# Altium footprint library Passive THD.PCBLIB: 80 footprints (part 3 of 5)
Each footprint in its own frame and in the unit in brackets; x right, y up, seen from the top. Pads: shape width x height; smd on the part's side, far side on the other; paste and mask are expansions set on the pad; w line width, h text height; cw(c..) or ccw(c..) is an arc to the next point about the centre after c.
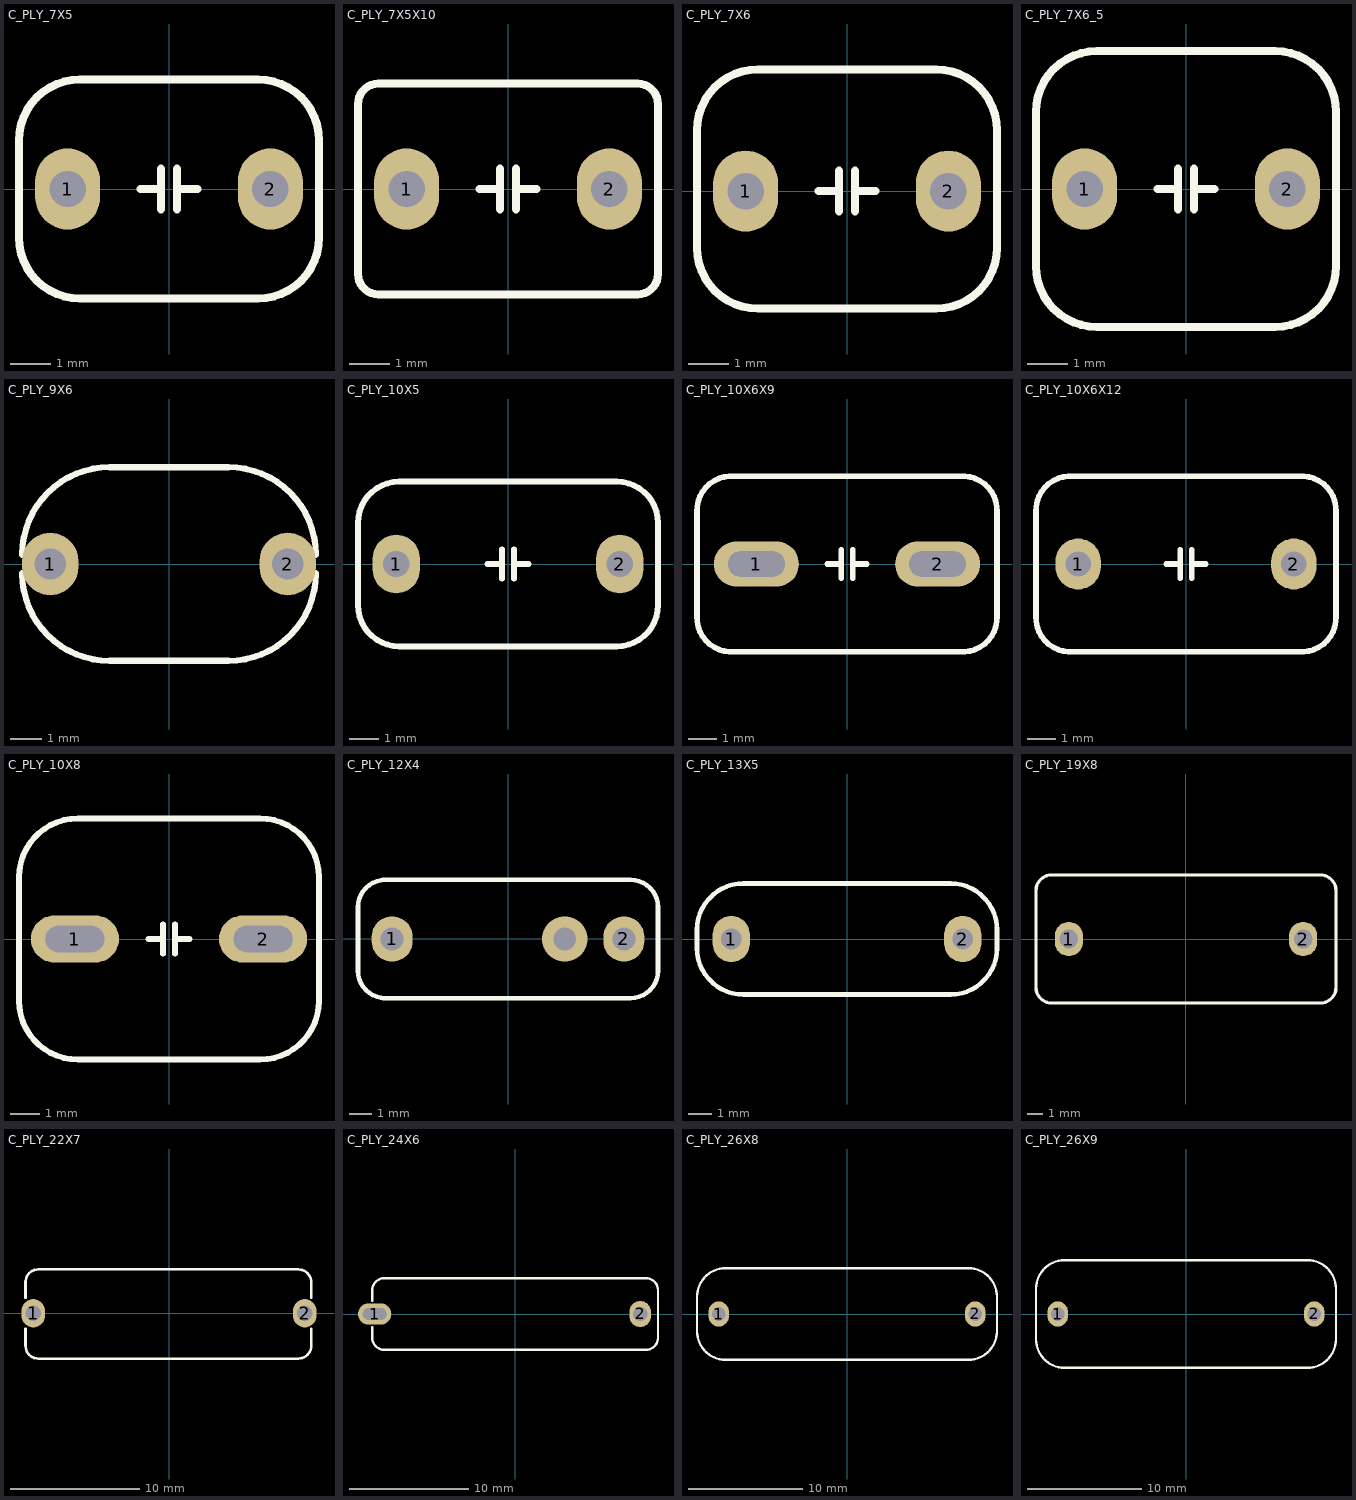
[diagram p2: the footprints below, top view; thin cyan lines are the x and y axes]

## C_PLY_7X5 [mm] "CAP, POLYESTER, 7.0X5.0mm pitch: 5.0mm"
height 7
pads (2):
  oval 1.6x2 hole 0.9: 1(-2.5,0) 2(2.5,0)
TopOverlay:
  lines w0.2: -0.7,0 -0.2,0 ; -0.2,-0.5 -0.2,0.5 ; 0.2,-0.5 0.2,0.5 ; 0.2,0 0.7,0 ; -3.7,-1.2 ccw(c-2.2,-1.2) -2.2,-2.7 2.2,-2.7 ccw(c2.2,-1.2) 3.7,-1.2 3.7,1.2 ccw(c2.2,1.2) 2.2,2.7 -2.2,2.7 ccw(c-2.2,1.2) -3.7,1.2 -3.7,-1.2
3D body "Cap, film, 7.3x5.2x7x5LS.STP": height 8, standoff -2, extent -3.65,-2.6 3.65,2.6

## C_PLY_7X5X10 [mm] "CAP, POLYESTER, 7.0X5.0x10mm pitch: 5.0mm"
height 7
pads (2):
  oval 1.6x2 hole 0.9: 1(-2.5,0) 2(2.5,0)
TopOverlay:
  lines w0.2: -0.7,0 -0.2,0 ; -0.2,-0.5 -0.2,0.5 ; 0.2,-0.5 0.2,0.5 ; 0.2,0 0.7,0 ; -3.7,-2.1 ccw(c-3.2,-2.1) -3.2,-2.6 3.2,-2.6 ccw(c3.2,-2.1) 3.7,-2.1 3.7,2.1 ccw(c3.2,2.1) 3.2,2.6 -3.2,2.6 ccw(c-3.2,2.1) -3.7,2.1 -3.7,-2.1
3D body "User Library-WIMA Capacitor_RM5-7.2X5X10.step": height 10, standoff -2.5, extent -3.6,-2.5 3.6,2.5

## C_PLY_7X6 [mm] "CAP, POLYESTER, 7.0X6.0mm pitch: 5.0mm"
height 7
pads (2):
  oval 1.6x2 hole 0.9: 1(-2.5,0) 2(2.5,0)
TopOverlay:
  lines w0.2: -0.7,0 -0.2,0 ; -0.2,-0.5 -0.2,0.5 ; 0.2,-0.5 0.2,0.5 ; 0.2,0 0.7,0 ; -3.7,-1.4 ccw(c-2.2,-1.4) -2.2,-2.9 2.2,-2.9 ccw(c2.2,-1.4) 3.7,-1.4 3.7,1.5 ccw(c2.2,1.5) 2.2,3 -2.2,3 ccw(c-2.2,1.5) -3.7,1.5 -3.7,-1.4
3D body "Cap, film, 7.3x5.7x7.3x5LS.STP": height 8.3, standoff -2, extent -3.65,-2.85 3.65,2.85

## C_PLY_7X6_5 [mm] "CAP, POLYESTER, 7.3X6.5mm pitch: 5.0mm"
height 10
pads (2):
  oval 1.6x2 hole 0.9: 1(-2.5,0) 2(2.5,0)
TopOverlay:
  lines w0.2: -0.7,0 -0.2,0 ; -0.2,-0.5 -0.2,0.5 ; 0.2,-0.5 0.2,0.5 ; 0.2,0 0.7,0 ; -3.7,-1.9 ccw(c-2.2,-1.9) -2.2,-3.4 2.2,-3.4 ccw(c2.2,-1.9) 3.7,-1.9 3.7,1.9 ccw(c2.2,1.9) 2.2,3.4 -2.2,3.4 ccw(c-2.2,1.9) -3.7,1.9 -3.7,-1.9
3D body "Cap, film, 7.3x6.5x10x5LS.STP": height 11, standoff -2, extent -3.65,-3.25 3.65,3.25

## C_PLY_9X6 [mm] "CAP, POLYESTER, 9.3X5.2mm pitch: 7.6mm"
pads (2):
  oval 1.8x2 hole 1: 1(-3.8,0) 2(3.8,0)
TopOverlay:
  lines w0.2: -4.7,-0.3 ccw(c-1.9,-0.3) -1.9,-3.1 1.9,-3.1 ccw(c1.9,-0.3) 4.7,-0.3 ; -4.7,0.3 cw(c-1.9,0.3) -1.9,3.1 1.9,3.1 cw(c1.9,0.3) 4.7,0.3
3D body "Cap 100n - 400V Poly.STEP": height 11.68, standoff -2.24, extent -4.585,-2.931 4.686,2.988

## C_PLY_10X5 [mm] "CAP, POLYESTER, 10X5.5mm pitch: 7.6mm"
height 9
pads (2):
  oval 1.6x2 hole 0.9 unplated mask+0.075: 1(-3.8,0) 2(3.8,0)
TopOverlay:
  lines w0.2: -0.7,0 -0.2,0 ; -0.2,-0.5 -0.2,0.5 ; 0.2,-0.5 0.2,0.5 ; 0.2,0 0.7,0 ; -5.1,-1.4 ccw(c-3.7,-1.4) -3.7,-2.8 3.7,-2.8 ccw(c3.7,-1.4) 5.1,-1.4 5.1,1.4 ccw(c3.7,1.4) 3.7,2.8 -3.7,2.8 ccw(c-3.7,1.4) -5.1,1.4 -5.1,-1.4
3D body "CAPF_5.5x9.0x10.0 TxHxW 7.5mmLS.STEP": height 9, standoff -2.54, extent -5,-2.75 5,2.75

## C_PLY_10X6X9 [mm] "CAP, POLYESTER, 10.5X6.0X9.0mm pitch: 7.6mm"
height 9
pads (2):
  oval 3x1.6 hole 0.9 slot 2 at 0 deg unplated mask+0.075: 1(-3.2,0) 2(3.2,0)
TopOverlay:
  lines w0.2: -0.7,0 -0.2,0 ; -0.2,-0.5 -0.2,0.5 ; 0.2,-0.5 0.2,0.5 ; 0.2,0 0.7,0 ; -5.299,-1.843 ccw(c-4.1,-1.9) -4.157,-3.099 4.157,-3.099 ccw(c4.1,-1.9) 5.299,-1.843 5.299,1.843 ccw(c4.1,1.9) 4.157,3.099 -4.157,3.099 ccw(c-4.1,1.9) -5.299,1.843 -5.299,-1.843
3D body "CAPF_6.0x9.0x10.5 TxHxW 7.5mmLS.STEP": height 9, standoff -2.54, extent -5.25,-3 5.25,3

## C_PLY_10X6X12 [mm] "CAP, POLYESTER, 10.3X6.0X12.0mm pitch: 7.6mm"
height 6
pads (2):
  oval 1.6x1.8 hole 0.9 unplated: 1(-3.81,0) 2(3.81,0)
TopOverlay:
  lines w0.2: -0.7,0 -0.2,0 ; -0.2,-0.5 -0.2,0.5 ; 0.2,-0.5 0.2,0.5 ; 0.2,0 0.7,0 ; -5.299,-1.843 ccw(c-4.1,-1.9) -4.157,-3.099 4.157,-3.099 ccw(c4.1,-1.9) 5.299,-1.843 5.299,1.843 ccw(c4.1,1.9) 4.157,3.099 -4.157,3.099 ccw(c-4.1,1.9) -5.299,1.843 -5.299,-1.843
3D body "CAPMF_10.3x6.0x13.0mm WxTxH 7.5mmLS.STEP": height 13, standoff -2.54, extent -5.15,-3 5.15,3

## C_PLY_10X8 [mm] "CAP, POLYESTER, 10.0X8.0 pitch: 7.6mm"
height 10
pads (2):
  oval 3x1.6 hole 0.9 slot 2 at 0 deg unplated mask+0.075: 1(-3.2,0) 2(3.2,0)
TopOverlay:
  lines w0.2: -0.7,0 -0.2,0 ; -0.2,-0.5 -0.2,0.5 ; 0.2,-0.5 0.2,0.5 ; 0.2,0 0.7,0 ; -5.1,-2.1 ccw(c-3.1,-2.1) -3.1,-4.1 3.1,-4.1 ccw(c3.1,-2.1) 5.1,-2.1 5.1,2.1 ccw(c3.1,2.1) 3.1,4.1 -3.1,4.1 ccw(c-3.1,2.1) -5.1,2.1 -5.1,-2.1
3D body "mfcap_7.5mm 10x8x11mm.stp": height 11, standoff -2.54, extent -5,-4 5,4

## C_PLY_12X4 [mm] "CAP, POLYESTER, 12.5X4.5X9.0 pitch: 10mm"
height 9
pads (2):
  oval 1.8x2 hole 1: 1(-5.1,0) 2(5.1,0)
via 2.5,0 diameter 2 hole 1
TopOverlay:
  lines w0.2: -5.5,-2.6 5.4,-2.6 ccw(c5.4,-1.4) 6.6,-1.4 6.6,1.4 ccw(c5.4,1.4) 5.4,2.6 -5.5,2.6 ; -5.4,-2.6 cw(c-5.4,-1.4) -6.6,-1.4 -6.6,1.4 cw(c-5.4,1.4) -5.4,2.6
3D body "User Library-Capacitor MKT_B32591C3104 (Pitch 10mm).step": height 12.5, standoff -6, extent -6.5,-2.5 6.5,2.5

## C_PLY_13X5 [mm] "CAP, POLYESTER, 12.8X4.8 pitch: 10mm"
pads (2):
  oval 1.6x2 hole 0.9: 1(-5,0) 2(5,0)
TopOverlay:
  lines w0.2: -6.48,-0.4 ccw(c-4.48,-0.4) -4.48,-2.4 4.48,-2.4 ccw(c4.48,-0.4) 6.48,-0.4 6.48,0.4 ccw(c4.48,0.4) 4.48,2.4 -4.48,2.4 ccw(c-4.48,0.4) -6.48,0.4 -6.48,-0.4
3D body "Cap 10n - 630V Poly_2009.STEP": height 12.19, standoff -1.73, extent -6.375,-2.401 6.375,2.35

## C_PLY_19X8 [mm] "CAP, POLYESTER, 19.0X8.0mm pitch: 15.0mm, 0.22uF 400V"
pads (2):
  oval 1.8x2.2 hole 1.2: 1(-7.5,0) 2(7.5,0)
TopOverlay:
  lines w0.2: -9.6,-3.1 ccw(c-8.6,-3.1) -8.6,-4.1 8.6,-4.1 ccw(c8.6,-3.1) 9.6,-3.1 9.6,3.1 ccw(c8.6,3.1) 8.6,4.1 -8.6,4.1 ccw(c-8.6,3.1) -9.6,3.1 -9.6,-3.1
3D body "User Library-CAP_POLY_15mm.step": height 16, standoff -4, extent -9.5,-4 9.5,4

## C_PLY_22X7 [mm] "CAP, POLYESTER, 33.0X7.0mm pitch: 20.0mm, 0.68uF 400V"
pads (2):
  oval 1.8x2.2 hole 1.2: 1(-10.5,0) 2(10.5,0)
TopOverlay:
  lines w0.2: -11.1,-1.2 -11.1,-2.5 ccw(c-10.1,-2.5) -10.1,-3.5 10,-3.5 ccw(c10,-2.5) 11,-2.5 11,-1.2 ; -11.1,1.2 -11.1,2.5 ; -11.1,2.4 cw(c-10.1,2.4) -10.1,3.4 10,3.4 cw(c10,2.4) 11,2.4 ; 11,1.2 11,2.5
3D body "User Library-ECQE(F) 0_33uf 630Vdc 250Vac.step": height 19, standoff -3, extent -13,-3.9 13,3.9

## C_PLY_24X6 [mm] "CAP, POLYESTER, 23.8X5.8mm pitch: 20.0mm, 0.33uF 400V"
pads (2):
  oval 2.8x1.8 hole 1 slot 2 at 0 deg: 1(-11.8,0)
  oval 1.8x2.2 hole 1.2: 2(10.5,0)
TopOverlay:
  lines w0.2: -12,-2.1 -12,-1.1 ; -12,-2 ccw(c-11,-2) -11,-3 11,-3 ccw(c11,-2) 12,-2 12,2.1 ; -12,1.1 -12,2.1 ; -12,2 cw(c-11,2) -11,3 11,3 cw(c11,2) 12,2
3D body "Cap 330n - 400V Poly_2009.STEP": height 10.92, standoff -3, extent -11.888,-2.85 11.862,2.901

## C_PLY_26X8 [mm] "CAP, POLYESTER, 26.0X7.8mm pitch: 20.0mm, 0.68uF 400V"
pads (2):
  oval 1.8x2.2 hole 1.2: 1(-11.2,0) 2(11.2,0)
TopOverlay:
  lines w0.2: -13.1,-1.5 ccw(c-10.6,-1.5) -10.6,-4 10.6,-4 ccw(c10.6,-1.5) 13.1,-1.5 13.1,1.5 ccw(c10.6,1.5) 10.6,4 -10.6,4 ccw(c-10.6,1.5) -13.1,1.5 -13.1,-1.5
3D body "User Library-ECQE(F) 0_33uf 630Vdc 250Vac.step": height 19, standoff -3, extent -13,-3.9 13,3.9

## C_PLY_26X9 [mm] "CAP, POLYESTER, 26.0X9.3mm pitch: 20.0mm, 0.68uF 400V"
pads (2):
  oval 1.8x2.2 hole 1.2: 1(-11.2,0) 2(11.2,0)
TopOverlay:
  lines w0.2: -13.1,-2.2 ccw(c-10.6,-2.2) -10.6,-4.7 10.6,-4.7 ccw(c10.6,-2.2) 13.1,-2.2 13.1,2.2 ccw(c10.6,2.2) 10.6,4.7 -10.6,4.7 ccw(c-10.6,2.2) -13.1,2.2 -13.1,-2.2
3D body "SW3dPS-ECQE(F) 0.47uf 630Vdc 250Vac.STEP": height 3, standoff -20.5, extent -13,-4.65 13,4.65